# Altium footprint library Herry.PcbLib: 58 footprints (part 1 of 4)
Each footprint in its own frame and in the unit in brackets; x right, y up, seen from the top. Pads: shape width x height; smd on the part's side, far side on the other; paste and mask are expansions set on the pad; w line width, h text height; cw(c..) or ccw(c..) is an arc to the next point about the centre after c.
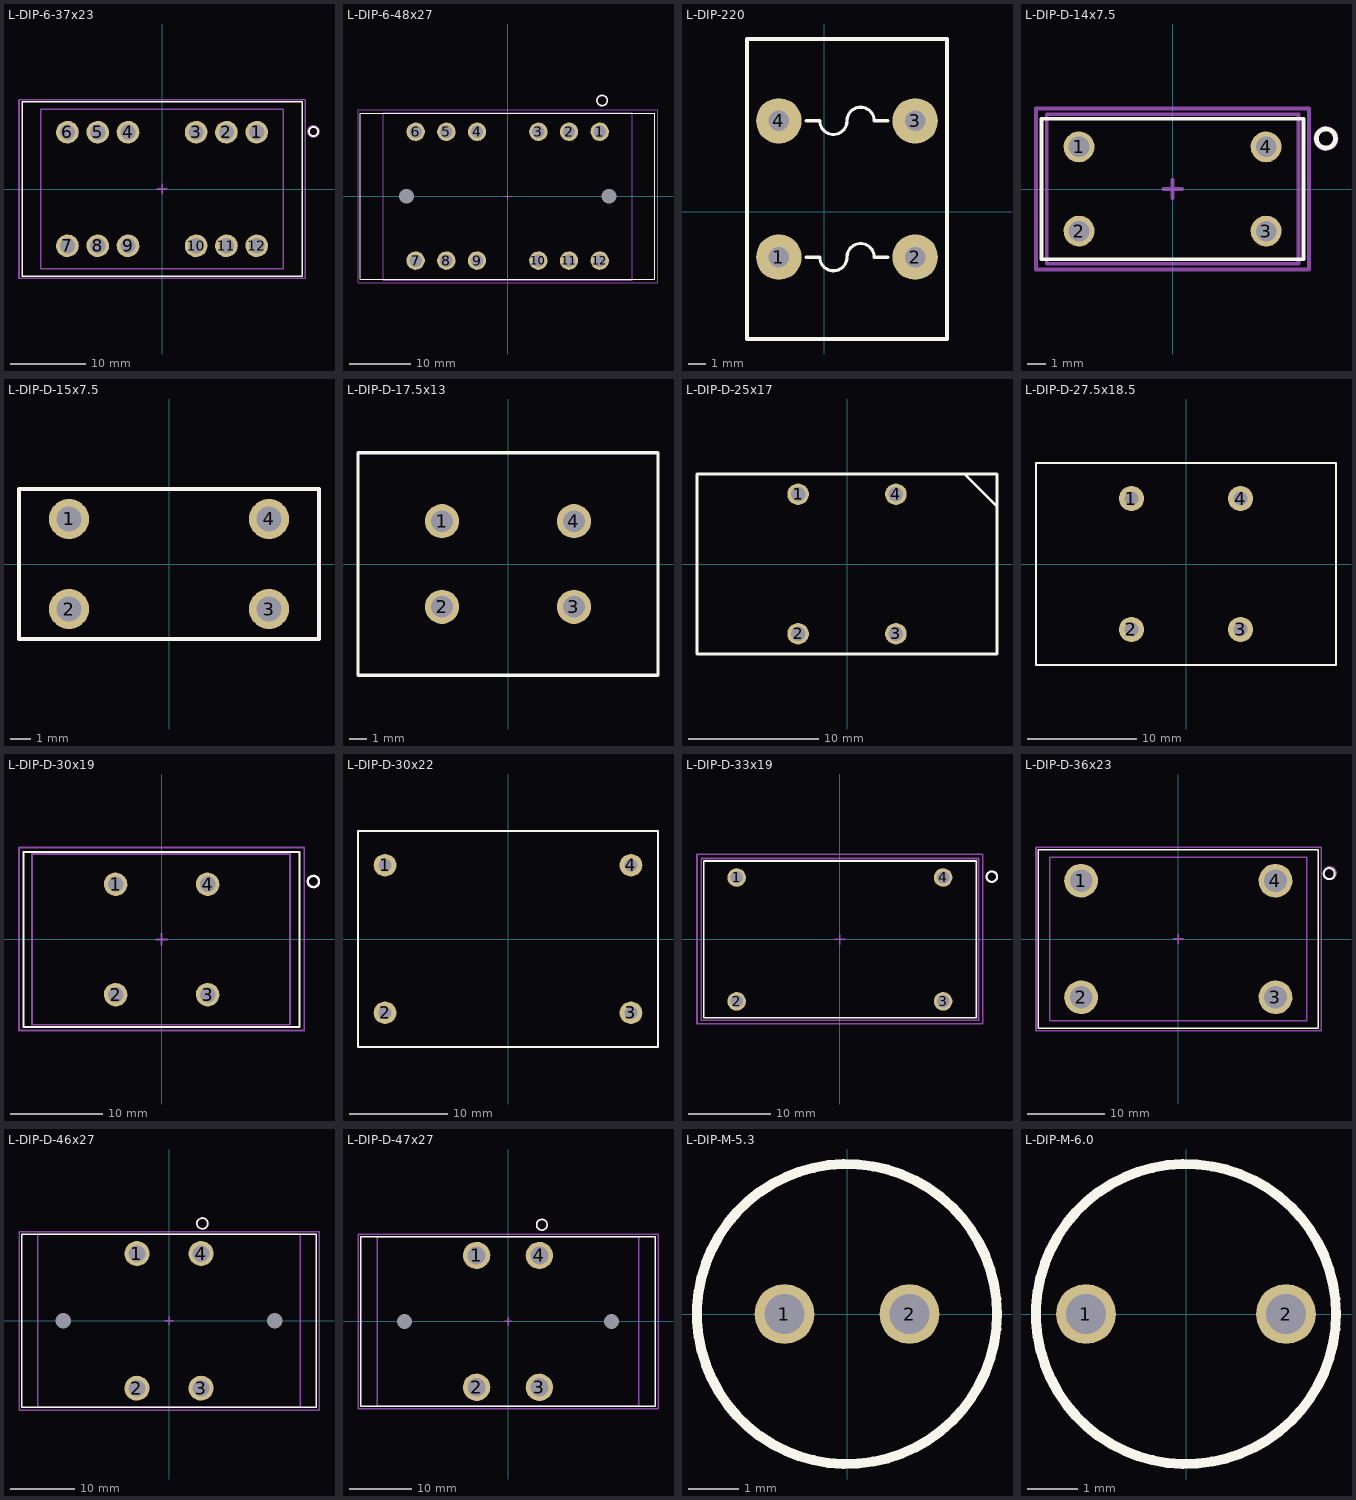
[diagram p0: the footprints below, top view; thin cyan lines are the x and y axes]

## L-DIP-6-37x23 [mm] "THT-12pin- Body 37mmx23mm"
height 36
pads (12):
  round 3 hole 2: 1(12.5,7.5) 2(8.5,7.5) 3(4.5,7.5) 4(-4.5,7.5) 5(-8.5,7.5) 6(-12.5,7.5) 7(-12.5,-7.5) 8(-8.5,-7.5) 9(-4.5,-7.5) 10(4.5,-7.5) 11(8.5,-7.5) 12(12.5,-7.5)
Top Overlay:
  circle w0.254: c20,7.6 r0.608
  lines w0.2: -18.5,-11.5 18.5,-11.5 18.5,11.5 -18.5,11.5 -18.5,-11.5
Mechanical 13:
  lines w0.2: -16.002,-10.541 -16.002,10.541 16.002,10.541 16.002,-10.541 -16.002,-10.541
Mechanical 15:
  circle w0.254: c20,7.6 r0.728
  lines w0.2: -0.635,0 0.635,0 ; 0,-0.635 0,0.635 ; -18.9,-11.8 -18.9,11.8 18.9,11.8 18.9,-11.8 -18.9,-11.8
  text ".Designator" at 0,0 h0.76
3D body "7448053201_37x23x35_trifilar_without pins.stp": height 30.75, standoff -4.9, extent -15.77,-10.3 15.766,10.3

## L-DIP-6-48x27 [mm] "THT-12pin- Body 48mmx27mm"
height 46
pads (14):
  round 3 hole 2 mask+0.102: 1(15,10.5) 2(10,10.5) 3(5,10.5) 4(-5,10.5) 5(-10,10.5) 6(-15,10.5) 7(-15,-10.5) 8(-10,-10.5) 9(-5,-10.5) 10(5,-10.5) 11(10,-10.5) 12(15,-10.5)
  round 0 hole 2.4 unplated: mh1(16.5,0) mh2(-16.5,0)
Top Overlay:
  circle w0.254: c15.4,15.6 r0.854
  lines w0.2: -24,-13.5 -24,13.5 24,13.5 24,-13.5 -24,-13.5
Mechanical 13:
  lines w0.2: -20.32,-13.7 20.3,-13.7 20.3,13.6 -20.32,13.6 -20.32,-13.7
Mechanical 15:
  circle w0.254: c15.4,15.6 r0.806
  lines w0.2: -0.635,0 0.635,0 ; 0,-0.635 0,0.635 ; -24.4,-14.1 24.5,-14.1 24.5,14.1 -24.4,14.1 -24.4,-14.1
  text ".Designator" at 0,-0.1 h0.76
3D body "7448063801_48x27x46_trifilar_wop.stp": height 39, standoff -5.1, extent -20,-13.25 20,13.25

## L-DIP-220 [mil] "Loc 220"
pads (4):
  round 100 hole 45: 1(-100,-100) 2(200,-100) 3(200,200) 4(-100,200)
Top Overlay:
  lines w7: -10,-100 ccw(c20,-100) 50,-100 cw(c80,-100) 110,-100 ; -10,200 ccw(c20,200) 50,200 cw(c80,200) 110,200
  lines w8: -40,-100 -10,-100 ; -40,200 -10,200 ; 110,-100 140,-100 ; 110,200 140,200 ; -170,-280 270,-280 270,380 -170,380 -170,-280

## L-DIP-D-14x7.5 [mm] "THT-4pin- Body 14x7.5mm"
height 16
pads (4):
  round 1.65 hole 1.1: 1(-5,2.25) 2(-5,-2.25) 3(5,-2.25) 4(5,2.25)
Top Overlay:
  circle w0.254: c8.2,2.7 r0.51
  lines w0.2: -7,3.75 -7,-3.75 7,-3.75 7,3.75 ; -6.985,3.75 6.985,3.75
Mechanical 13:
  lines w0.2: -6.731,-4 -6.731,4 6.731,4 6.731,-4 -6.731,-4
Mechanical 15:
  circle w0.254: c8.2,2.7 r0.539
  lines w0.2: -0.5,0 0.5,0 ; 0,-0.5 0,0.5 ; -7.3,-4.3 7.3,-4.3 7.3,4.3 -7.3,4.3 -7.3,-4.3
  text ".Designator" at 0,0 h0.76
3D body "7448010911_14x7,5x16.stp": height 14.6, standoff -2.5, extent -6.5,-3.75 6.5,3.75

## L-DIP-D-15x7.5 [mm] "THT Inductor, 2-Leads, Body 15,0x7,5mm"
height 18
pads (4):
  round 2 hole 1.27: 1(-5,2.25) 2(-5,-2.25) 3(5,-2.25) 4(5,2.25)
Top Overlay:
  lines w0.2: -7.5,-3.75 -7.5,3.75 7.5,3.75 7.5,-3.75 -7.5,-3.75
Mechanical 1:
  lines w0.1: -7.5,-3.75 -7.5,3.75 7.5,3.75 7.5,-3.75 -7.5,-3.75
3D body "744821240.stp": height 16.22, standoff -3.6, extent -6.897,-3.75 6.897,3.75

## L-DIP-D-17.5x13 [mm] "THT Inductor, 4-Leads, Body 17,5x13,0mm"
height 22
pads (4):
  round 2 hole 1.27: 1(-3.85,2.5) 2(-3.85,-2.5) 3(3.85,-2.5) 4(3.85,2.5)
Top Overlay:
  lines w0.2: -8.75,-6.5 -8.75,6.5 8.75,6.5 8.75,-6.5 -8.75,-6.5
Mechanical 1:
  lines w0.1: -8.75,-6.5 -8.75,6.5 8.75,6.5 8.75,-6.5 -8.75,-6.5
3D body "744822301.stp": height 20.01, standoff -2.99, extent -7.769,-6.5 7.769,6.5

## L-DIP-D-25x17 [mm] "THT Inductor, 4-Leads, Body 25,0x17,0mm"
height 28
pads (4):
  round 1.65 hole 1.1: 1(-3.75,5.35) 2(-3.75,-5.35) 3(3.75,-5.35) 4(3.75,5.35)
Top Overlay:
  lines w0.2: 9,6.9 11.5,4.4 ; -11.5,-6.9 -11.5,6.9 11.5,6.9 11.5,-6.9 -11.5,-6.9
Mechanical 1:
  lines w0.1: -11.5,-6.9 -11.5,6.9 11.5,6.9 11.5,-6.9 -11.5,-6.9
3D body "744823220_M.stp": height 23.09, standoff -5.01, extent -9.55,-6.5 9.55,6.5

## L-DIP-D-27.5x18.5 [mm] "THT Inductor, 4-Leads, Body 27,5x18,5mm"
height 33
pads (4):
  round 2.3 hole 1.3: 1(-5,6) 2(-5,-6) 3(5,-6) 4(5,6)
Top Overlay:
  lines w0.2: -13.75,-9.25 13.75,-9.25 13.75,9.25 -13.75,9.25 -13.75,-9.25
Mechanical 1:
  lines w0.1: -13.75,-9.25 13.75,-9.25 13.75,9.25 -13.75,9.25 -13.75,-9.25
3D body "744824407.stp": height 33, standoff -5, extent -13.75,-9.3 13.75,9.2

## L-DIP-D-30x19 [mm] "THT-4pin- Body 30x19mm"
height 32
pads (4):
  round 2.55 hole 1.7: 1(-5,6) 2(-5,-6) 3(5,-6) 4(5,6)
Top Overlay:
  circle w0.254: c16.5,6.3 r0.608
  lines w0.2: -15,-9.5 15,-9.5 15,9.5 -15,9.5 -15,-9.5
Mechanical 13:
  lines w0.2: -14.097,-9.271 -14.097,9.271 13.97,9.271 13.97,-9.271 -14.097,-9.271
Mechanical 15:
  circle w0.254: c16.5,6.3 r0.6
  lines w0.2: -0.635,0 0.635,0 ; 0,-0.635 0,0.635 ; -15.5,-9.9 -15.5,10 15.5,10 15.5,-9.9 -15.5,-9.9
  text ".Designator" at 0,0 h0.76
3D body "7448041502.stp": height 25.72, standoff -4.75, extent -13.75,-9 13.75,9

## L-DIP-D-30x22 [mm] "THT Inductor, 4-Leads, Body 30,0x22,0mm"
height 35
pads (4):
  round 2.3 hole 1.3: 1(-12.5,7.5) 2(-12.5,-7.5) 3(12.5,-7.5) 4(12.5,7.5)
Top Overlay:
  lines w0.2: -15.25,-11 15.25,-11 15.25,11 -15.25,11 -15.25,-11
Mechanical 1:
  lines w0.1: -15.25,-11 15.25,-11 15.25,11 -15.25,11 -15.25,-11
3D body "7448258022.stp": height 35.13, standoff -5, extent -15,-10.5 15,10.5

## L-DIP-D-33x19 [mm] "THT-4pin- Body 33mmx19mm"
height 39
pads (4):
  round 2.25 hole 1.5: 1(-12.5,7.5) 2(-12.5,-7.5) 3(12.5,-7.5) 4(12.5,7.5)
Top Overlay:
  circle w0.254: c18.4,7.6 r0.632
  lines w0.2: -16.5,-9.5 16.5,-9.5 16.5,9.5 -16.5,9.5 -16.5,-9.5
Mechanical 13:
  lines w0.2: -16.8,-9.8 16.8,-9.8 16.8,9.8 -16.8,9.8 -16.8,-9.8
Mechanical 15:
  circle w0.254: c18.4,7.6 r0.632
  lines w0.2: -0.635,0 0.635,0 ; 0,-0.635 0,0.635 ; -17.3,-10.2 -17.3,10.3 17.3,10.3 17.3,-10.2 -17.3,-10.2
  text ".Designator" at 0,0 h0.76
3D body "7448050490_33x19x39.stp": height 35.25, standoff -4.95, extent -16.5,-9.5 16.5,9.5

## L-DIP-D-36x23 [mm] "THT-4pin- Body 36mmx23mm"
height 36
pads (4):
  round 4.35 hole 2.9: 1(-12.5,7.5) 2(-12.5,-7.5) 3(12.5,-7.5) 4(12.5,7.5)
Top Overlay:
  circle w0.254: c19.4,8.4 r0.707
  lines w0.2: -18,-11.5 18,-11.5 18,11.5 -18,11.5 -18,-11.5
Mechanical 13:
  lines w0.2: -16.51,-10.541 -16.51,10.541 16.51,10.541 16.51,-10.541 -16.51,-10.541
Mechanical 15:
  circle w0.254: c19.5,8.5 r0.781
  lines w0.2: -0.635,0 0.635,0 ; 0,-0.635 0,0.635 ; -18.3,-11.8 -18.3,11.8 18.4,11.8 18.4,-11.8 -18.3,-11.8
  text ".Designator" at 0.1,0 h0.76
3D body "7448052502_36x23x36_without pins.stp": height 31.29, standoff -4.9, extent -16.269,-10.3 16.27,10.3

## L-DIP-D-46x27 [mm] "THT-4pin- Body 46mmx27mm"
height 46
pads (6):
  round 3.9 hole 2.6: 1(-5,10.5) 2(-5,-10.5) 3(5,-10.5) 4(5,10.5)
  round 0 hole 2.4 unplated: mh1(16.5,0) mh2(-16.5,0)
Top Overlay:
  circle w0.254: c5.2,15.2 r0.854
  lines w0.2: -23,-13.5 -23,13.5 23,13.5 23,-13.5 -23,-13.5
Mechanical 13:
  lines w0.2: -20.5,-13.5 20.5,-13.5 20.5,13.5 -20.5,13.5 -20.5,-13.5
Mechanical 15:
  circle w0.254: c5.2,15.2 r0.806
  lines w0.2: -0.635,0 0.635,0 ; 0,-0.635 0,0.635 ; -23.4,-13.9 23.4,-13.9 23.4,13.9 -23.4,13.9 -23.4,-13.9
  text ".Designator" at 0,-0.1 h0.76
3D body "7448061507_46x27x46_wop.stp": height 39.1, standoff -5, extent -20.216,-13.25 20.22,13.25

## L-DIP-D-47x27 [mm] "THT-4pin- Body 47mmx27mm"
height 46
pads (6):
  round 4.35 hole 2.9: 1(-5,10.5) 2(-5,-10.5) 3(5,-10.5) 4(5,10.5)
  round 0 hole 2.4 unplated: mh1(16.5,0) mh2(-16.5,0)
Top Overlay:
  circle w0.254: c5.4,15.4 r0.854
  lines w0.2: -23.5,-13.5 23.5,-13.5 23.5,13.5 -23.5,13.5 -23.5,-13.5
Mechanical 13:
  lines w0.2: -20.8,-13.5 -20.8,13.5 20.8,13.5 20.8,-13.5 -20.8,-13.5
Mechanical 15:
  circle w0.254: c5.4,15.4 r0.806
  lines w0.2: -0.635,0 0.635,0 ; 0,-0.635 0,0.635 ; -23.9,-13.9 -23.9,13.9 23.9,13.9 23.9,-13.9 -23.9,-13.9
  text ".Designator" at 0,-0.1 h0.76
3D body "7448062603_47x27x46_wop.stp": height 39.1, standoff -5, extent -20.528,-13.25 20.528,13.25

## L-DIP-M-5.3 [mm] "THT Inductor, 2-Leads, Body 5.3  mm"
height 8.5
pads (2):
  round 1.2 hole 0.8: 1(-1.25,0) 2(1.25,0)
Top Overlay:
  circle w0.2: c0,0 r3
Mechanical 1:
  circle w0.1: c0,0 r3
3D body "7447462xx.stp": height 7.6, standoff -3.5, extent -2.44,-2.44 2.44,2.45

## L-DIP-M-6.0 [mm] "THT Inductor, 2-Leads, Body 6,0  mm"
height 6.5
pads (2):
  round 1.2 hole 0.8: 1(-2,0) 2(2,0)
Top Overlay:
  circle w0.2: c0,0 r3
Mechanical 1:
  circle w0.1: c0,0 r3
3D body "744779100.stp": height 6.51, standoff -3.99, extent -3,-3 3,3